# Altium schematic symbol library Sang_library.SchLib: 1607 symbols (part 12 of 15) (continued)
## STM32F051R8T6_1 (continued)

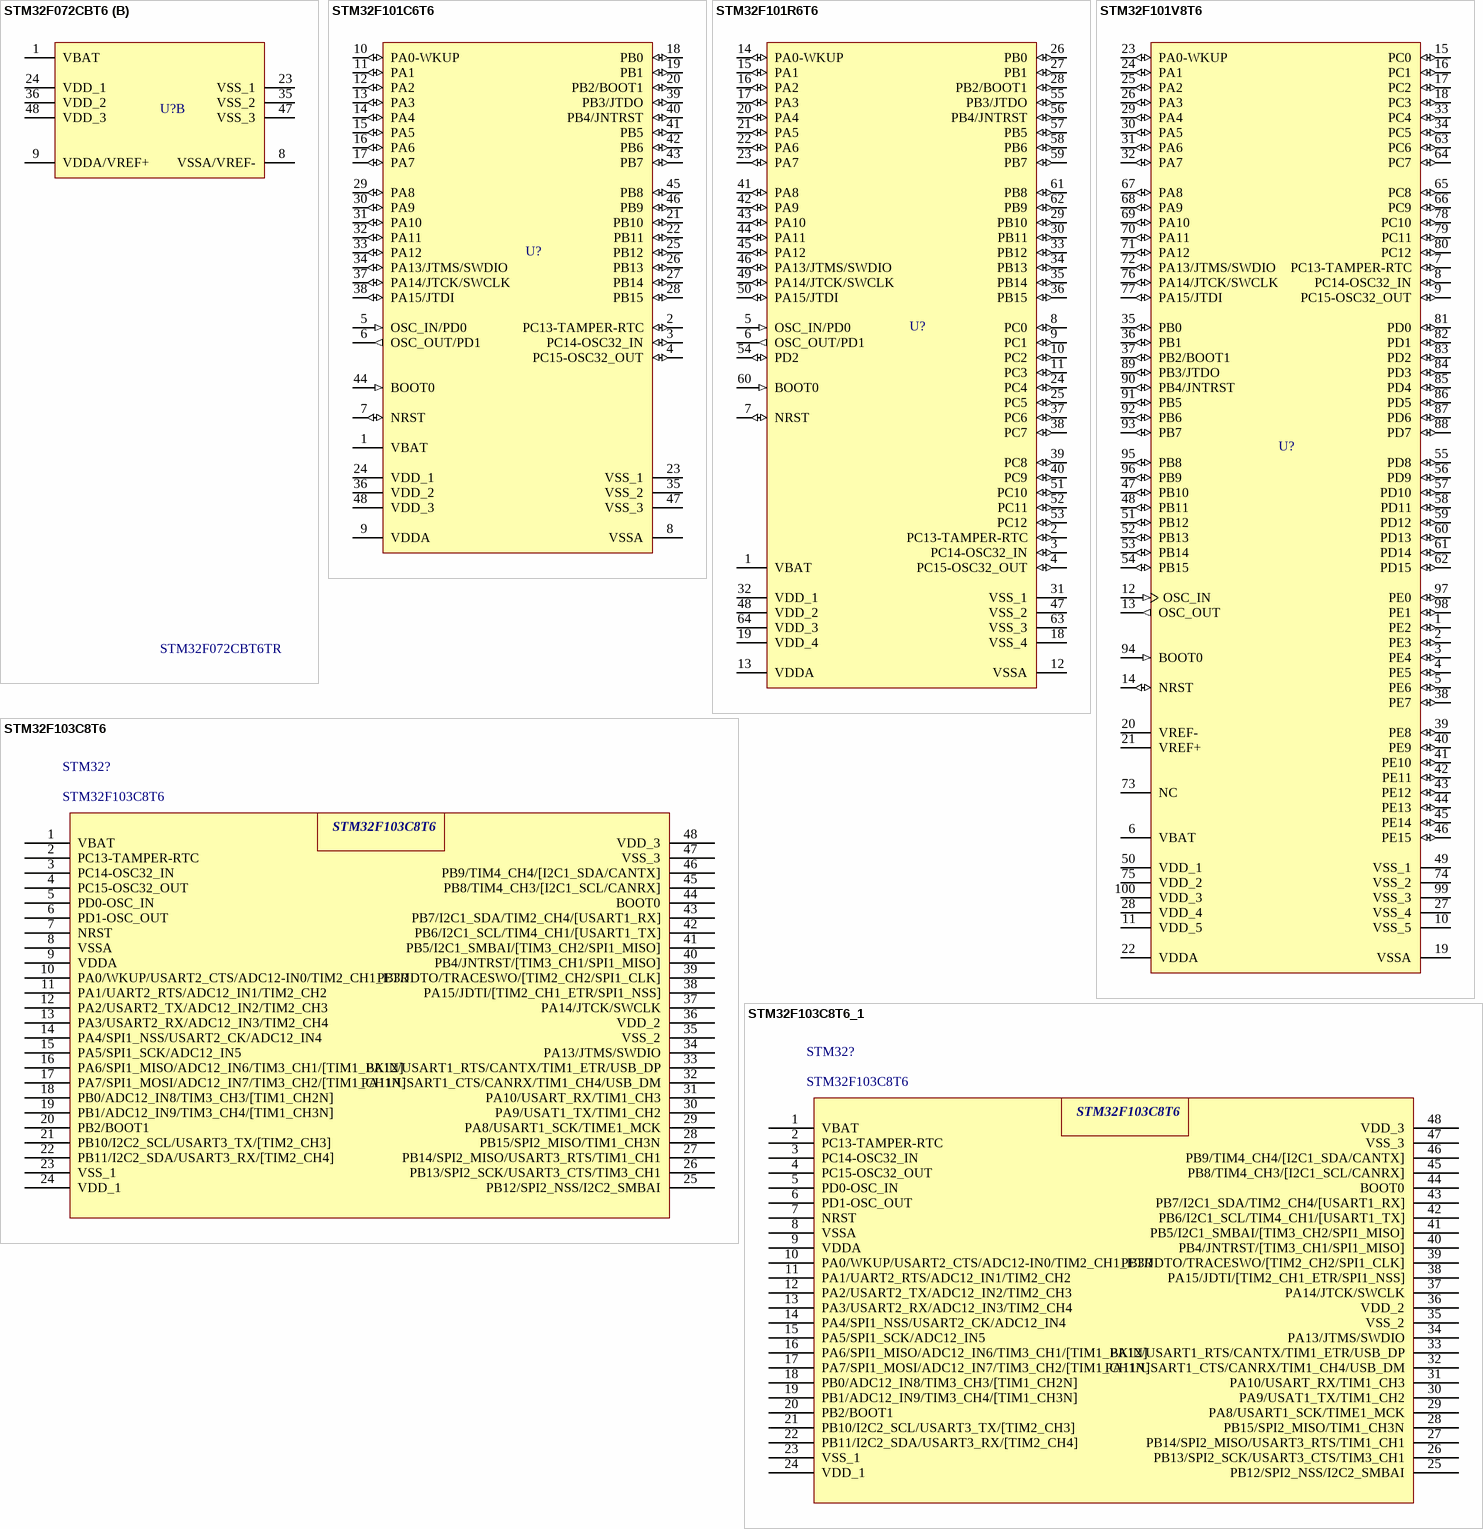
[diagram p77: symbols STM32F072CBT6 to STM32F103C8T6_1]

## STM32F072CBT6
designator U?, comment STM32F072CBT6TR
IC MCU 32BIT 128KB FLASH 48LQFP; MFR: STM; Solder: SMT; Value: STM32F072CBT6TR; MPN: STM32F072CBT6TR; Category: IC
footprint LQFP-48 (Low Profile Quad Flat Pack (LQFP), 0.50 mm pitch; square, 12 pin X 12 pin, 7.00 mm L X 7.00 mm W X 1.60 mm H body)
part A pins: 2 PC13 (io) "PC14-OSC32_IN(PC14)/OSC32_IN", 3 PC14-OSC32_IN(PC14) (io) "PC14-OSC32_IN(PC14)/OSC32_IN", 4 PC15-OSC32_OUT(PC15) (io) "PC15-OSC32_OUT(PC15)/OSC32_OUT", 5 PF0-OSC_IN(PF0) (io) "PF0-OSC_IN(PF0)/TIM1_CH3N,I2C2_SDA/OSC_IN", 6 PF1-OSC_OUT(PF1) (io) "PF1-OSC_OUT(PF1)/I2C2_SCL/OSC_OUT", 7 NRST (io) "Device reset input / internal reset output (active low)", 10 PA0/U4TX (io), 11 PA1/U4RX (io), 12 PA2/U2TX (io), 13 PA3/U2RX (io), 14 PA4/ADC4 (io), 15 PA5/ADC5 (io), 16 PA6/ADC6 (io), 17 PA7/ADC7 (io), 18 PB0 (io), 19 PB1 (io), 20 PB2 (io), 21 U3TX/PB10 (io), 22 U3RX/PB11 (io), 25 PB12 (io), 26 PB13 (io), 27 PB14 (io), 28 PB15 (io), 29 PA8 (io), 30 PA9/U1TX (io), 31 PA10/U1RX (io), 32 PA11 (io), 33 PA12 (io), 34 PA13/SWDIO (io), 37 PA14/SWCLK (io), 38 PA15 (io), 39 PB3 (io), 40 PB4 (io), 41 PB5 (io), 42 PB6 (io), 43 PB7 (io), 44 BOOT0 (in) "Boot memory selection", 45 I2C1SCL/PB8 (io), 46 I2C1SDA/PB9 (io)
part B pins: 1 VBAT (power) "Backup power supply", 8 VSSA/VREF- (power) "Analog ground/Negative reference voltage", 9 VDDA/VREF+ (power) "Analog power supply/Positive reference voltage", 23 VSS_1 (power) "Ground", 24 VDD_1 (power) "Digital power supply", 35 VSS_2 (power) "Digital ground", 36 VDD_2 (power) "Digital power supply", 47 VSS_3 (power) "Digital ground", 48 VDD_3 (power) "Digital power supply"

## STM32F101C6T6
designator U?
STM32 ARM-based 32-bit MCU with 32 Kbytes Flash, 48-pin LQFP, Industrial Temperature; Published: 30-May-2008; DatasheetVersion: rev6, Mar-2008; PackageVersion: Mar-2008; PackageReference: LQFP48; Publisher: Altium Limited; PackageDescription: 48-Pin Low-Profile Quad Flat Pack, 7 x 7 mm Body, 0.5 mm Pitch (LQFP48); ComponentLink1Description: Manufacturer Link; ComponentLink1URL: www.st.com/stm32; ComponentLink2Description: Datasheet; ComponentLink2URL: http://www.st.com/stonline/products/literature/ds/13586.pdf
footprint TQFP48 (TQFP, 48-Leads, Body 7.00x7.00mm, Pitch 0.50mm, IPC High Density)
pins: 1 VBAT (power), 2 PC13-TAMPER-RTC (io), 3 PC14-OSC32_IN (io), 4 PC15-OSC32_OUT (io), 5 OSC_IN/PD0 (in), 6 OSC_OUT/PD1 (out), 7 NRST (io), 8 VSSA (power), 9 VDDA (power), 10 PA0-WKUP (io), 11 PA1 (io), 12 PA2 (io), 13 PA3 (io), 14 PA4 (io), 15 PA5 (io), 16 PA6 (io), 17 PA7 (io), 18 PB0 (io), 19 PB1 (io), 20 PB2/BOOT1 (io), 21 PB10 (io), 22 PB11 (io), 23 VSS_1 (power), 24 VDD_1 (power), 25 PB12 (io), 26 PB13 (io), 27 PB14 (io), 28 PB15 (io), 29 PA8 (io), 30 PA9 (io), 31 PA10 (io), 32 PA11 (io), 33 PA12 (io), 34 PA13/JTMS/SWDIO (io), 35 VSS_2 (power), 36 VDD_2 (power), 37 PA14/JTCK/SWCLK (io), 38 PA15/JTDI (io), 39 PB3/JTDO (io), 40 PB4/JNTRST (io), 41 PB5 (io), 42 PB6 (io), 43 PB7 (io), 44 BOOT0 (in), 45 PB8 (io), 46 PB9 (io), 47 VSS_3 (power), 48 VDD_3 (power)

## STM32F101R6T6
designator U?
STM32 ARM-based 32-bit MCU with 32 Kbytes Flash, 64-pin LQFP, Industrial Temperature; Published: 30-May-2008; DatasheetVersion: rev6, Mar-2008; PackageVersion: Mar-2008; PackageReference: LQFP64; Publisher: Altium Limited; PackageDescription: 64-Pin Low-Profile Quad Flat Pack, 10 x 10 mm Body, 0.5 mm Pitch (LQFP64); ComponentLink1Description: Manufacturer Link; ComponentLink1URL: www.st.com/stm32; ComponentLink2Description: Datasheet; ComponentLink2URL: http://www.st.com/stonline/products/literature/ds/13586.pdf
footprint TQFP64 (TQFP, 64-Leads, Body 10.00x10.00mm, Pitch 0.50mm, IPC High Density)
pins: 1 VBAT (power), 2 PC13-TAMPER-RTC (io), 3 PC14-OSC32_IN (io), 4 PC15-OSC32_OUT (io), 5 OSC_IN/PD0 (in), 6 OSC_OUT/PD1 (out), 7 NRST (io), 8 PC0 (io), 9 PC1 (io), 10 PC2 (io), 11 PC3 (io), 12 VSSA (power), 13 VDDA (power), 14 PA0-WKUP (io), 15 PA1 (io), 16 PA2 (io), 17 PA3 (io), 18 VSS_4 (power), 19 VDD_4 (power), 20 PA4 (io), 21 PA5 (io), 22 PA6 (io), 23 PA7 (io), 24 PC4 (io), 25 PC5 (io), 26 PB0 (io), 27 PB1 (io), 28 PB2/BOOT1 (io), 29 PB10 (io), 30 PB11 (io), 31 VSS_1 (power), 32 VDD_1 (power), 33 PB12 (io), 34 PB13 (io), 35 PB14 (io), 36 PB15 (io), 37 PC6 (io), 38 PC7 (io), 39 PC8 (io), 40 PC9 (io), 41 PA8 (io), 42 PA9 (io), 43 PA10 (io), 44 PA11 (io), 45 PA12 (io), 46 PA13/JTMS/SWDIO (io), 47 VSS_2 (power), 48 VDD_2 (power), 49 PA14/JTCK/SWCLK (io), 50 PA15/JTDI (io), 51 PC10 (io), 52 PC11 (io), 53 PC12 (io), 54 PD2 (io), 55 PB3/JTDO (io), 56 PB4/JNTRST (io), 57 PB5 (io), 58 PB6 (io), 59 PB7 (io), 60 BOOT0 (in), 61 PB8 (io), 62 PB9 (io), 63 VSS_3 (power), 64 VDD_3 (power)

## STM32F101V8T6
designator U?
STM32 ARM-based 32-bit MCU with 64 Kbytes Flash, 100-pin LQFP, Industrial Temperature; Published: 30-May-2008; DatasheetVersion: rev6, Mar-2008; PackageVersion: Mar-2008; PackageReference: LQFP100; Publisher: Altium Limited; PackageDescription: 100-Pin Low-Profile Quad Flat Pack, 14 x 14 mm Body, 0.5 mm Pitch (LQFP100); ComponentLink1Description: Manufacturer Link; ComponentLink1URL: www.st.com/stm32; ComponentLink2Description: Datasheet; ComponentLink2URL: http://www.st.com/stonline/products/literature/ds/13586.pdf
footprint TQFP100L (TQFP, 100-Leads, Body 14.00x14.00mm, Pitch 0.50mm, IPC High Density)
pins: 1 PE2 (io), 2 PE3 (io), 3 PE4 (io), 4 PE5 (io), 5 PE6 (io), 6 VBAT (power), 7 PC13-TAMPER-RTC (io), 8 PC14-OSC32_IN (io), 9 PC15-OSC32_OUT (io), 10 VSS_5 (power), 11 VDD_5 (power), 12 OSC_IN (in), 13 OSC_OUT (out), 14 NRST (io), 15 PC0 (io), 16 PC1 (io), 17 PC2 (io), 18 PC3 (io), 19 VSSA (power), 20 VREF- (power), 21 VREF+ (power), 22 VDDA (power), 23 PA0-WKUP (io), 24 PA1 (io), 25 PA2 (io), 26 PA3 (io), 27 VSS_4 (power), 28 VDD_4 (power), 29 PA4 (io), 30 PA5 (io), 31 PA6 (io), 32 PA7 (io), 33 PC4 (io), 34 PC5 (io), 35 PB0 (io), 36 PB1 (io), 37 PB2/BOOT1 (io), 38 PE7 (io), 39 PE8 (io), 40 PE9 (io), 41 PE10 (io), 42 PE11 (io), 43 PE12 (io), 44 PE13 (io), 45 PE14 (io), 46 PE15 (io), 47 PB10 (io), 48 PB11 (io), 49 VSS_1 (power), 50 VDD_1 (power), 51 PB12 (io), 52 PB13 (io), 53 PB14 (io), 54 PB15 (io), 55 PD8 (io), 56 PD9 (io), 57 PD10 (io), 58 PD11 (io), 59 PD12 (io), 60 PD13 (io), 61 PD14 (io), 62 PD15 (io), 63 PC6 (io), 64 PC7 (io), 65 PC8 (io), 66 PC9 (io), 67 PA8 (io), 68 PA9 (io), 69 PA10 (io), 70 PA11 (io), 71 PA12 (io), 72 PA13/JTMS/SWDIO (io), 73 NC, 74 VSS_2 (power), 75 VDD_2 (power), 76 PA14/JTCK/SWCLK (io), 77 PA15/JTDI (io), 78 PC10 (io), 79 PC11 (io), 80 PC12 (io), 81 PD0 (io), 82 PD1 (io), 83 PD2 (io), 84 PD3 (io), 85 PD4 (io), 86 PD5 (io), 87 PD6 (io), 88 PD7 (io), 89 PB3/JTDO (io), 90 PB4/JNTRST (io), 91 PB5 (io), 92 PB6 (io), 93 PB7 (io), 94 BOOT0 (in), 95 PB8 (io), 96 PB9 (io), 97 PE0 (io), 98 PE1 (io), 99 VSS_3 (power), 100 VDD_3 (power)

## STM32F103C8T6
designator STM32?
Dán; Ma_Hang: MH000567; Don_Vi: Con; Ten_Linh_Kien: STM32F103C8T6; Kieu_Chan: *; Ghi_Chu: *; Chung_Loai: Dán
pins: 1 VBAT, 2 PC13-TAMPER-RTC, 3 PC14-OSC32_IN, 4 PC15-OSC32_OUT, 5 PD0-OSC_IN, 6 PD1-OSC_OUT, 7 NRST, 8 VSSA, 9 VDDA, 10 PA0/WKUP/USART2_CTS/ADC12-IN0/TIM2_CH1_ETR, 11 PA1/UART2_RTS/ADC12_IN1/TIM2_CH2, 12 PA2/USART2_TX/ADC12_IN2/TIM2_CH3, 13 PA3/USART2_RX/ADC12_IN3/TIM2_CH4, 14 PA4/SPI1_NSS/USART2_CK/ADC12_IN4, 15 PA5/SPI1_SCK/ADC12_IN5, 16 PA6/SPI1_MISO/ADC12_IN6/TIM3_CH1/[TIM1_BKIN], 17 PA7/SPI1_MOSI/ADC12_IN7/TIM3_CH2/[TIM1_CH1N], 18 PB0/ADC12_IN8/TIM3_CH3/[TIM1_CH2N], 19 PB1/ADC12_IN9/TIM3_CH4/[TIM1_CH3N], 20 PB2/BOOT1, 21 PB10/I2C2_SCL/USART3_TX/[TIM2_CH3], 22 PB11/I2C2_SDA/USART3_RX/[TIM2_CH4], 23 VSS_1, 24 VDD_1, 25 PB12/SPI2_NSS/I2C2_SMBAI, 26 PB13/SPI2_SCK/USART3_CTS/TIM3_CH1, 27 PB14/SPI2_MISO/USART3_RTS/TIM1_CH1, 28 PB15/SPI2_MISO/TIM1_CH3N, 29 PA8/USART1_SCK/TIME1_MCK, 30 PA9/USAT1_TX/TIM1_CH2, 31 PA10/USART_RX/TIM1_CH3, 32 PA11/USART1_CTS/CANRX/TIM1_CH4/USB_DM, 33 PA12/USART1_RTS/CANTX/TIM1_ETR/USB_DP, 34 PA13/JTMS/SWDIO, 35 VSS_2, 36 VDD_2, 37 PA14/JTCK/SWCLK, 38 PA15/JDTI/[TIM2_CH1_ETR/SPI1_NSS], 39 PB3/JDTO/TRACESWO/[TIM2_CH2/SPI1_CLK], 40 PB4/JNTRST/[TIM3_CH1/SPI1_MISO], 41 PB5/I2C1_SMBAI/[TIM3_CH2/SPI1_MISO], 42 PB6/I2C1_SCL/TIM4_CH1/[USART1_TX], 43 PB7/I2C1_SDA/TIM2_CH4/[USART1_RX], 44 BOOT0, 45 PB8/TIM4_CH3/[I2C1_SCL/CANRX], 46 PB9/TIM4_CH4/[I2C1_SDA/CANTX], 47 VSS_3, 48 VDD_3

## STM32F103C8T6_1
designator STM32?, comment STM32F103C8T6
Dán; Ma_Hang: MH000567; Don_Vi: Con; Ten_Linh_Kien: STM32F103C8T6; Kieu_Chan: *; Ghi_Chu: *; Chung_Loai: Dán
pins: 1 VBAT, 2 PC13-TAMPER-RTC, 3 PC14-OSC32_IN, 4 PC15-OSC32_OUT, 5 PD0-OSC_IN, 6 PD1-OSC_OUT, 7 NRST, 8 VSSA, 9 VDDA, 10 PA0/WKUP/USART2_CTS/ADC12-IN0/TIM2_CH1_ETR, 11 PA1/UART2_RTS/ADC12_IN1/TIM2_CH2, 12 PA2/USART2_TX/ADC12_IN2/TIM2_CH3, 13 PA3/USART2_RX/ADC12_IN3/TIM2_CH4, 14 PA4/SPI1_NSS/USART2_CK/ADC12_IN4, 15 PA5/SPI1_SCK/ADC12_IN5, 16 PA6/SPI1_MISO/ADC12_IN6/TIM3_CH1/[TIM1_BKIN], 17 PA7/SPI1_MOSI/ADC12_IN7/TIM3_CH2/[TIM1_CH1N], 18 PB0/ADC12_IN8/TIM3_CH3/[TIM1_CH2N], 19 PB1/ADC12_IN9/TIM3_CH4/[TIM1_CH3N], 20 PB2/BOOT1, 21 PB10/I2C2_SCL/USART3_TX/[TIM2_CH3], 22 PB11/I2C2_SDA/USART3_RX/[TIM2_CH4], 23 VSS_1, 24 VDD_1, 25 PB12/SPI2_NSS/I2C2_SMBAI, 26 PB13/SPI2_SCK/USART3_CTS/TIM3_CH1, 27 PB14/SPI2_MISO/USART3_RTS/TIM1_CH1, 28 PB15/SPI2_MISO/TIM1_CH3N, 29 PA8/USART1_SCK/TIME1_MCK, 30 PA9/USAT1_TX/TIM1_CH2, 31 PA10/USART_RX/TIM1_CH3, 32 PA11/USART1_CTS/CANRX/TIM1_CH4/USB_DM, 33 PA12/USART1_RTS/CANTX/TIM1_ETR/USB_DP, 34 PA13/JTMS/SWDIO, 35 VSS_2, 36 VDD_2, 37 PA14/JTCK/SWCLK, 38 PA15/JDTI/[TIM2_CH1_ETR/SPI1_NSS], 39 PB3/JDTO/TRACESWO/[TIM2_CH2/SPI1_CLK], 40 PB4/JNTRST/[TIM3_CH1/SPI1_MISO], 41 PB5/I2C1_SMBAI/[TIM3_CH2/SPI1_MISO], 42 PB6/I2C1_SCL/TIM4_CH1/[USART1_TX], 43 PB7/I2C1_SDA/TIM2_CH4/[USART1_RX], 44 BOOT0, 45 PB8/TIM4_CH3/[I2C1_SCL/CANRX], 46 PB9/TIM4_CH4/[I2C1_SDA/CANTX], 47 VSS_3, 48 VDD_3

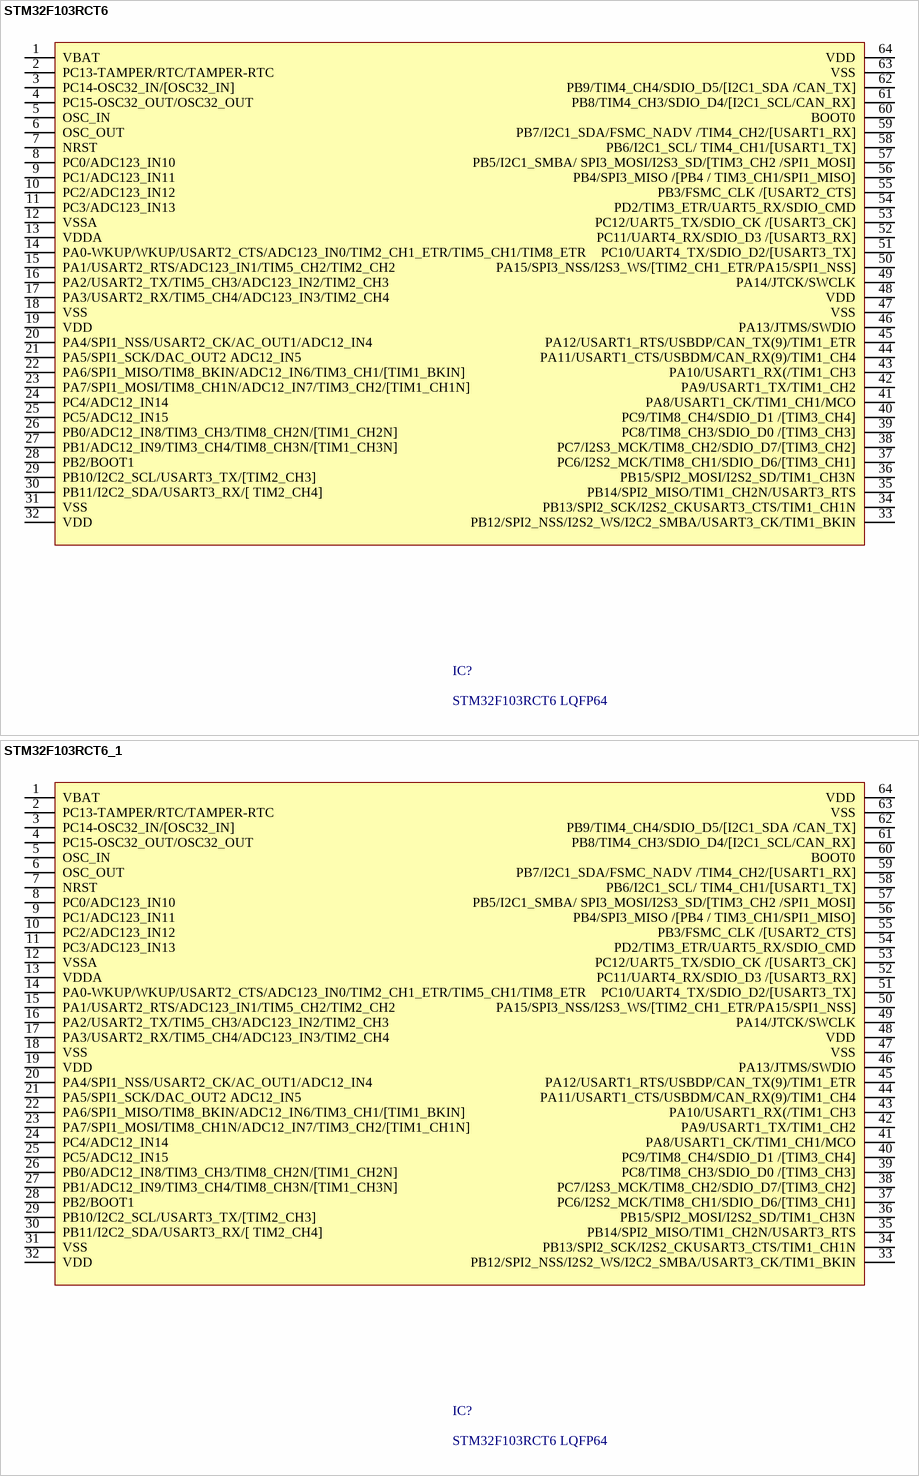
[diagram p78: symbols STM32F103RCT6 to STM32F103RCT6_1]

## STM32F103RCT6
designator IC?, comment STM32F103RCT6 LQFP64
Dán; Ma_Hang: MH002495; Don_Vi: Con; Ten_Linh_Kien: STM32F103RCT6 LQFP64; Kieu_Chan: *; Ghi_Chu: *; Chung_Loai: Dán
pins: 1 VBAT, 2 PC13-TAMPER/RTC/TAMPER-RTC, 3 PC14-OSC32_IN/[OSC32_IN], 4 PC15-OSC32_OUT/OSC32_OUT, 5 OSC_IN, 6 OSC_OUT, 7 NRST, 8 PC0/ADC123_IN10, 9 PC1/ADC123_IN11, 10 PC2/ADC123_IN12, 11 PC3/ADC123_IN13, 12 VSSA, 13 VDDA, 14 PA0-WKUP/WKUP/USART2_CTS/ADC123_IN0/TIM2_CH1_ETR/TIM5_CH1/TIM8_ETR, 15 PA1/USART2_RTS/ADC123_IN1/TIM5_CH2/TIM2_CH2, 16 PA2/USART2_TX/TIM5_CH3/ADC123_IN2/TIM2_CH3, 17 PA3/USART2_RX/TIM5_CH4/ADC123_IN3/TIM2_CH4, 18 VSS, 19 VDD, 20 PA4/SPI1_NSS/USART2_CK/AC_OUT1/ADC12_IN4, 21 PA5/SPI1_SCK/DAC_OUT2 ADC12_IN5, 22 PA6/SPI1_MISO/TIM8_BKIN/ADC12_IN6/TIM3_CH1/[TIM1_BKIN], 23 PA7/SPI1_MOSI/TIM8_CH1N/ADC12_IN7/TIM3_CH2/[TIM1_CH1N], 24 PC4/ADC12_IN14, 25 PC5/ADC12_IN15, 26 PB0/ADC12_IN8/TIM3_CH3/TIM8_CH2N/[TIM1_CH2N], 27 PB1/ADC12_IN9/TIM3_CH4/TIM8_CH3N/[TIM1_CH3N], 28 PB2/BOOT1, 29 PB10/I2C2_SCL/USART3_TX/[TIM2_CH3], 30 PB11/I2C2_SDA/USART3_RX/[ TIM2_CH4], 31 VSS, 32 VDD, 33 PB12/SPI2_NSS/I2S2_WS/I2C2_SMBA/USART3_CK/TIM1_BKIN, 34 PB13/SPI2_SCK/I2S2_CKUSART3_CTS/TIM1_CH1N, 35 PB14/SPI2_MISO/TIM1_CH2N/USART3_RTS, 36 PB15/SPI2_MOSI/I2S2_SD/TIM1_CH3N, 37 PC6/I2S2_MCK/TIM8_CH1/SDIO_D6/[TIM3_CH1], 38 PC7/I2S3_MCK/TIM8_CH2/SDIO_D7/[TIM3_CH2], 39 PC8/TIM8_CH3/SDIO_D0 /[TIM3_CH3], 40 PC9/TIM8_CH4/SDIO_D1 /[TIM3_CH4], 41 PA8/USART1_CK/TIM1_CH1/MCO, 42 PA9/USART1_TX/TIM1_CH2, 43 PA10/USART1_RX(/TIM1_CH3, 44 PA11/USART1_CTS/USBDM/CAN_RX(9)/TIM1_CH4, 45 PA12/USART1_RTS/USBDP/CAN_TX(9)/TIM1_ETR, 46 PA13/JTMS/SWDIO, 47 VSS, 48 VDD, 49 PA14/JTCK/SWCLK, 50 PA15/SPI3_NSS/I2S3_WS/[TIM2_CH1_ETR/PA15/SPI1_NSS], 51 PC10/UART4_TX/SDIO_D2/[USART3_TX], 52 PC11/UART4_RX/SDIO_D3 /[USART3_RX], 53 PC12/UART5_TX/SDIO_CK /[USART3_CK], 54 PD2/TIM3_ETR/UART5_RX/SDIO_CMD, 55 PB3/FSMC_CLK /[USART2_CTS], 56 PB4/SPI3_MISO /[PB4 / TIM3_CH1/SPI1_MISO], 57 PB5/I2C1_SMBA/ SPI3_MOSI/I2S3_SD/[TIM3_CH2 /SPI1_MOSI], 58 PB6/I2C1_SCL/ TIM4_CH1/[USART1_TX], 59 PB7/I2C1_SDA/FSMC_NADV /TIM4_CH2/[USART1_RX], 60 BOOT0, 61 PB8/TIM4_CH3/SDIO_D4/[I2C1_SCL/CAN_RX], 62 PB9/TIM4_CH4/SDIO_D5/[I2C1_SDA /CAN_TX], 63 VSS, 64 VDD

## STM32F103RCT6_1
designator IC?, comment STM32F103RCT6 LQFP64
Dán; Ma_Hang: MH002495; Don_Vi: Con; Ten_Linh_Kien: STM32F103RCT6 LQFP64; Kieu_Chan: *; Ghi_Chu: *; Chung_Loai: Dán
pins: 1 VBAT, 2 PC13-TAMPER/RTC/TAMPER-RTC, 3 PC14-OSC32_IN/[OSC32_IN], 4 PC15-OSC32_OUT/OSC32_OUT, 5 OSC_IN, 6 OSC_OUT, 7 NRST, 8 PC0/ADC123_IN10, 9 PC1/ADC123_IN11, 10 PC2/ADC123_IN12, 11 PC3/ADC123_IN13, 12 VSSA, 13 VDDA, 14 PA0-WKUP/WKUP/USART2_CTS/ADC123_IN0/TIM2_CH1_ETR/TIM5_CH1/TIM8_ETR, 15 PA1/USART2_RTS/ADC123_IN1/TIM5_CH2/TIM2_CH2, 16 PA2/USART2_TX/TIM5_CH3/ADC123_IN2/TIM2_CH3, 17 PA3/USART2_RX/TIM5_CH4/ADC123_IN3/TIM2_CH4, 18 VSS, 19 VDD, 20 PA4/SPI1_NSS/USART2_CK/AC_OUT1/ADC12_IN4, 21 PA5/SPI1_SCK/DAC_OUT2 ADC12_IN5, 22 PA6/SPI1_MISO/TIM8_BKIN/ADC12_IN6/TIM3_CH1/[TIM1_BKIN], 23 PA7/SPI1_MOSI/TIM8_CH1N/ADC12_IN7/TIM3_CH2/[TIM1_CH1N], 24 PC4/ADC12_IN14, 25 PC5/ADC12_IN15, 26 PB0/ADC12_IN8/TIM3_CH3/TIM8_CH2N/[TIM1_CH2N], 27 PB1/ADC12_IN9/TIM3_CH4/TIM8_CH3N/[TIM1_CH3N], 28 PB2/BOOT1, 29 PB10/I2C2_SCL/USART3_TX/[TIM2_CH3], 30 PB11/I2C2_SDA/USART3_RX/[ TIM2_CH4], 31 VSS, 32 VDD, 33 PB12/SPI2_NSS/I2S2_WS/I2C2_SMBA/USART3_CK/TIM1_BKIN, 34 PB13/SPI2_SCK/I2S2_CKUSART3_CTS/TIM1_CH1N, 35 PB14/SPI2_MISO/TIM1_CH2N/USART3_RTS, 36 PB15/SPI2_MOSI/I2S2_SD/TIM1_CH3N, 37 PC6/I2S2_MCK/TIM8_CH1/SDIO_D6/[TIM3_CH1], 38 PC7/I2S3_MCK/TIM8_CH2/SDIO_D7/[TIM3_CH2], 39 PC8/TIM8_CH3/SDIO_D0 /[TIM3_CH3], 40 PC9/TIM8_CH4/SDIO_D1 /[TIM3_CH4], 41 PA8/USART1_CK/TIM1_CH1/MCO, 42 PA9/USART1_TX/TIM1_CH2, 43 PA10/USART1_RX(/TIM1_CH3, 44 PA11/USART1_CTS/USBDM/CAN_RX(9)/TIM1_CH4, 45 PA12/USART1_RTS/USBDP/CAN_TX(9)/TIM1_ETR, 46 PA13/JTMS/SWDIO, 47 VSS, 48 VDD, 49 PA14/JTCK/SWCLK, 50 PA15/SPI3_NSS/I2S3_WS/[TIM2_CH1_ETR/PA15/SPI1_NSS], 51 PC10/UART4_TX/SDIO_D2/[USART3_TX], 52 PC11/UART4_RX/SDIO_D3 /[USART3_RX], 53 PC12/UART5_TX/SDIO_CK /[USART3_CK], 54 PD2/TIM3_ETR/UART5_RX/SDIO_CMD, 55 PB3/FSMC_CLK /[USART2_CTS], 56 PB4/SPI3_MISO /[PB4 / TIM3_CH1/SPI1_MISO], 57 PB5/I2C1_SMBA/ SPI3_MOSI/I2S3_SD/[TIM3_CH2 /SPI1_MOSI], 58 PB6/I2C1_SCL/ TIM4_CH1/[USART1_TX], 59 PB7/I2C1_SDA/FSMC_NADV /TIM4_CH2/[USART1_RX], 60 BOOT0, 61 PB8/TIM4_CH3/SDIO_D4/[I2C1_SCL/CAN_RX], 62 PB9/TIM4_CH4/SDIO_D5/[I2C1_SDA /CAN_TX], 63 VSS, 64 VDD

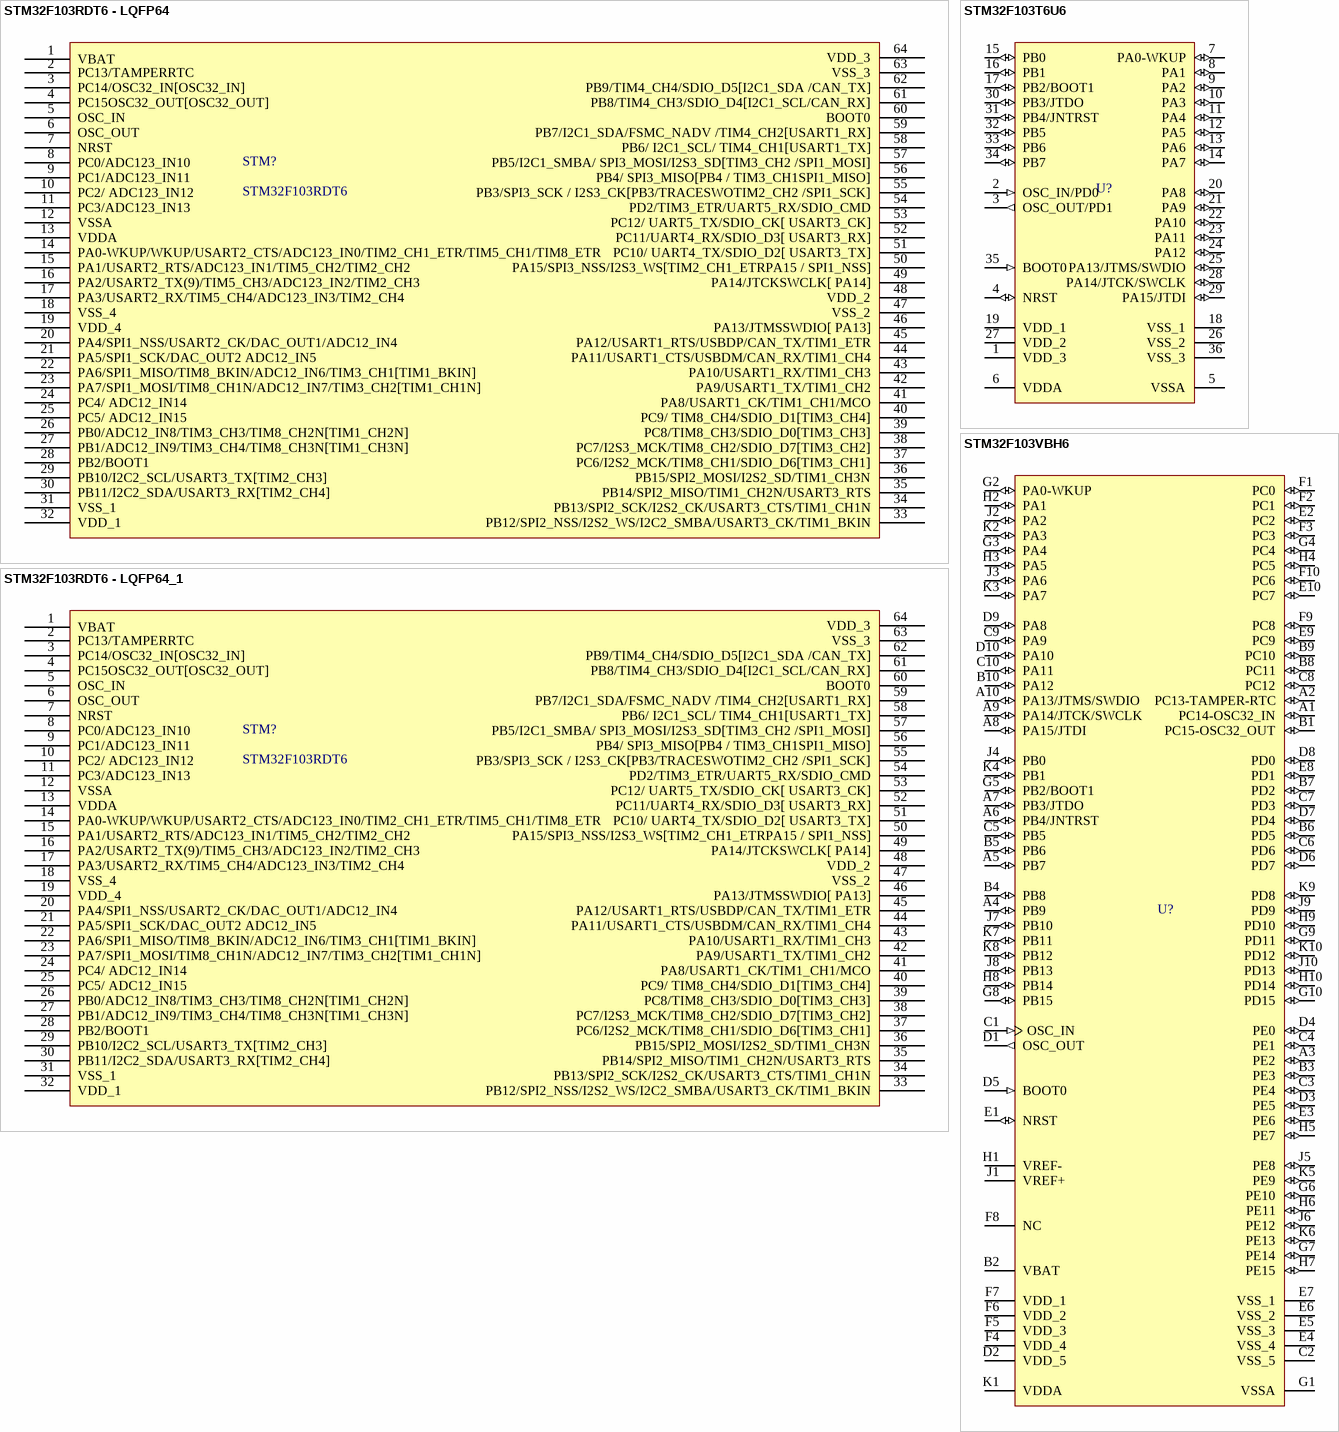
[diagram p79: symbols STM32F103RDT6 - LQFP64 to STM32F103VBH6]

## STM32F103RDT6 - LQFP64
designator STM?, comment STM32F103RDT6
Dán; Ma_Hang: MH004910; Ten_Linh_Kien: STM32F103RDT6 LQFP64; Don_Vi: Con; Kieu_Chan: *; Ghi_Chu: *; Chung_Loai: Dán
pins: 1 VBAT, 2 PC13/TAMPERRTC, 3 PC14/OSC32_IN[OSC32_IN], 4 PC15OSC32_OUT[OSC32_OUT], 5 OSC_IN, 6 OSC_OUT, 7 NRST, 8 PC0/ADC123_IN10, 9 PC1/ADC123_IN11, 10 PC2/ ADC123_IN12, 11 PC3/ADC123_IN13, 12 VSSA, 13 VDDA, 14 PA0-WKUP/WKUP/USART2_CTS/ADC123_IN0/TIM2_CH1_ETR/TIM5_CH1/TIM8_ETR, 15 PA1/USART2_RTS/ADC123_IN1/TIM5_CH2/TIM2_CH2, 16 PA2/USART2_TX(9)/TIM5_CH3/ADC123_IN2/TIM2_CH3, 17 PA3/USART2_RX/TIM5_CH4/ADC123_IN3/TIM2_CH4, 18 VSS_4, 19 VDD_4, 20 PA4/SPI1_NSS/USART2_CK/DAC_OUT1/ADC12_IN4, 21 PA5/SPI1_SCK/DAC_OUT2 ADC12_IN5 , 22 PA6/SPI1_MISO/TIM8_BKIN/ADC12_IN6/TIM3_CH1[TIM1_BKIN], 23 PA7/SPI1_MOSI/TIM8_CH1N/ADC12_IN7/TIM3_CH2[TIM1_CH1N], 24 PC4/ ADC12_IN14 , 25 PC5/ ADC12_IN15 , 26 PB0/ADC12_IN8/TIM3_CH3/TIM8_CH2N[TIM1_CH2N], 27 PB1/ADC12_IN9/TIM3_CH4/TIM8_CH3N[TIM1_CH3N], 28 PB2/BOOT1, 29 PB10/I2C2_SCL/USART3_TX[TIM2_CH3], 30 PB11/I2C2_SDA/USART3_RX[TIM2_CH4], 31 VSS_1, 32 VDD_1, 33 PB12/SPI2_NSS/I2S2_WS/I2C2_SMBA/USART3_CK/TIM1_BKIN, 34 PB13/SPI2_SCK/I2S2_CK/USART3_CTS/TIM1_CH1N, 35 PB14/SPI2_MISO/TIM1_CH2N/USART3_RTS, 36 PB15/SPI2_MOSI/I2S2_SD/TIM1_CH3N, 37 PC6/I2S2_MCK/TIM8_CH1/SDIO_D6[TIM3_CH1], 38 PC7/I2S3_MCK/TIM8_CH2/SDIO_D7[TIM3_CH2], 39 PC8/TIM8_CH3/SDIO_D0[TIM3_CH3], 40 PC9/ TIM8_CH4/SDIO_D1[TIM3_CH4], 41 PA8/USART1_CK/TIM1_CH1/MCO, 42 PA9/USART1_TX/TIM1_CH2, 43 PA10/USART1_RX/TIM1_CH3, 44 PA11/USART1_CTS/USBDM/CAN_RX/TIM1_CH4, 45 PA12/USART1_RTS/USBDP/CAN_TX/TIM1_ETR, 46 PA13/JTMSSWDIO[ PA13], 47 VSS_2, 48 VDD_2, 49 PA14/JTCKSWCLK[ PA14], 50 PA15/SPI3_NSS/I2S3_WS[TIM2_CH1_ETRPA15 / SPI1_NSS], 51 PC10/ UART4_TX/SDIO_D2[ USART3_TX], 52 PC11/UART4_RX/SDIO_D3[ USART3_RX], 53 PC12/ UART5_TX/SDIO_CK[ USART3_CK], 54 PD2/TIM3_ETR/UART5_RX/SDIO_CMD, 55 PB3/SPI3_SCK / I2S3_CK[PB3/TRACESWOTIM2_CH2 /SPI1_SCK], 56 PB4/ SPI3_MISO[PB4 / TIM3_CH1SPI1_MISO], 57 PB5/I2C1_SMBA/ SPI3_MOSI/I2S3_SD[TIM3_CH2 /SPI1_MOSI], 58 PB6/ I2C1_SCL/ TIM4_CH1[USART1_TX], 59 PB7/I2C1_SDA/FSMC_NADV /TIM4_CH2[USART1_RX], 60 BOOT0, 61 PB8/TIM4_CH3/SDIO_D4[I2C1_SCL/CAN_RX], 62 PB9/TIM4_CH4/SDIO_D5[I2C1_SDA /CAN_TX], 63 VSS_3, 64 VDD_3